# Altium footprint library 显示器件封装库.PcbLib: 45 footprints (part 1 of 3)
Each footprint in its own frame and in the unit in brackets; x right, y up, seen from the top. Pads: shape width x height; smd on the part's side, far side on the other; paste and mask are expansions set on the pad; w line width, h text height; cw(c..) or ccw(c..) is an arc to the next point about the centre after c.
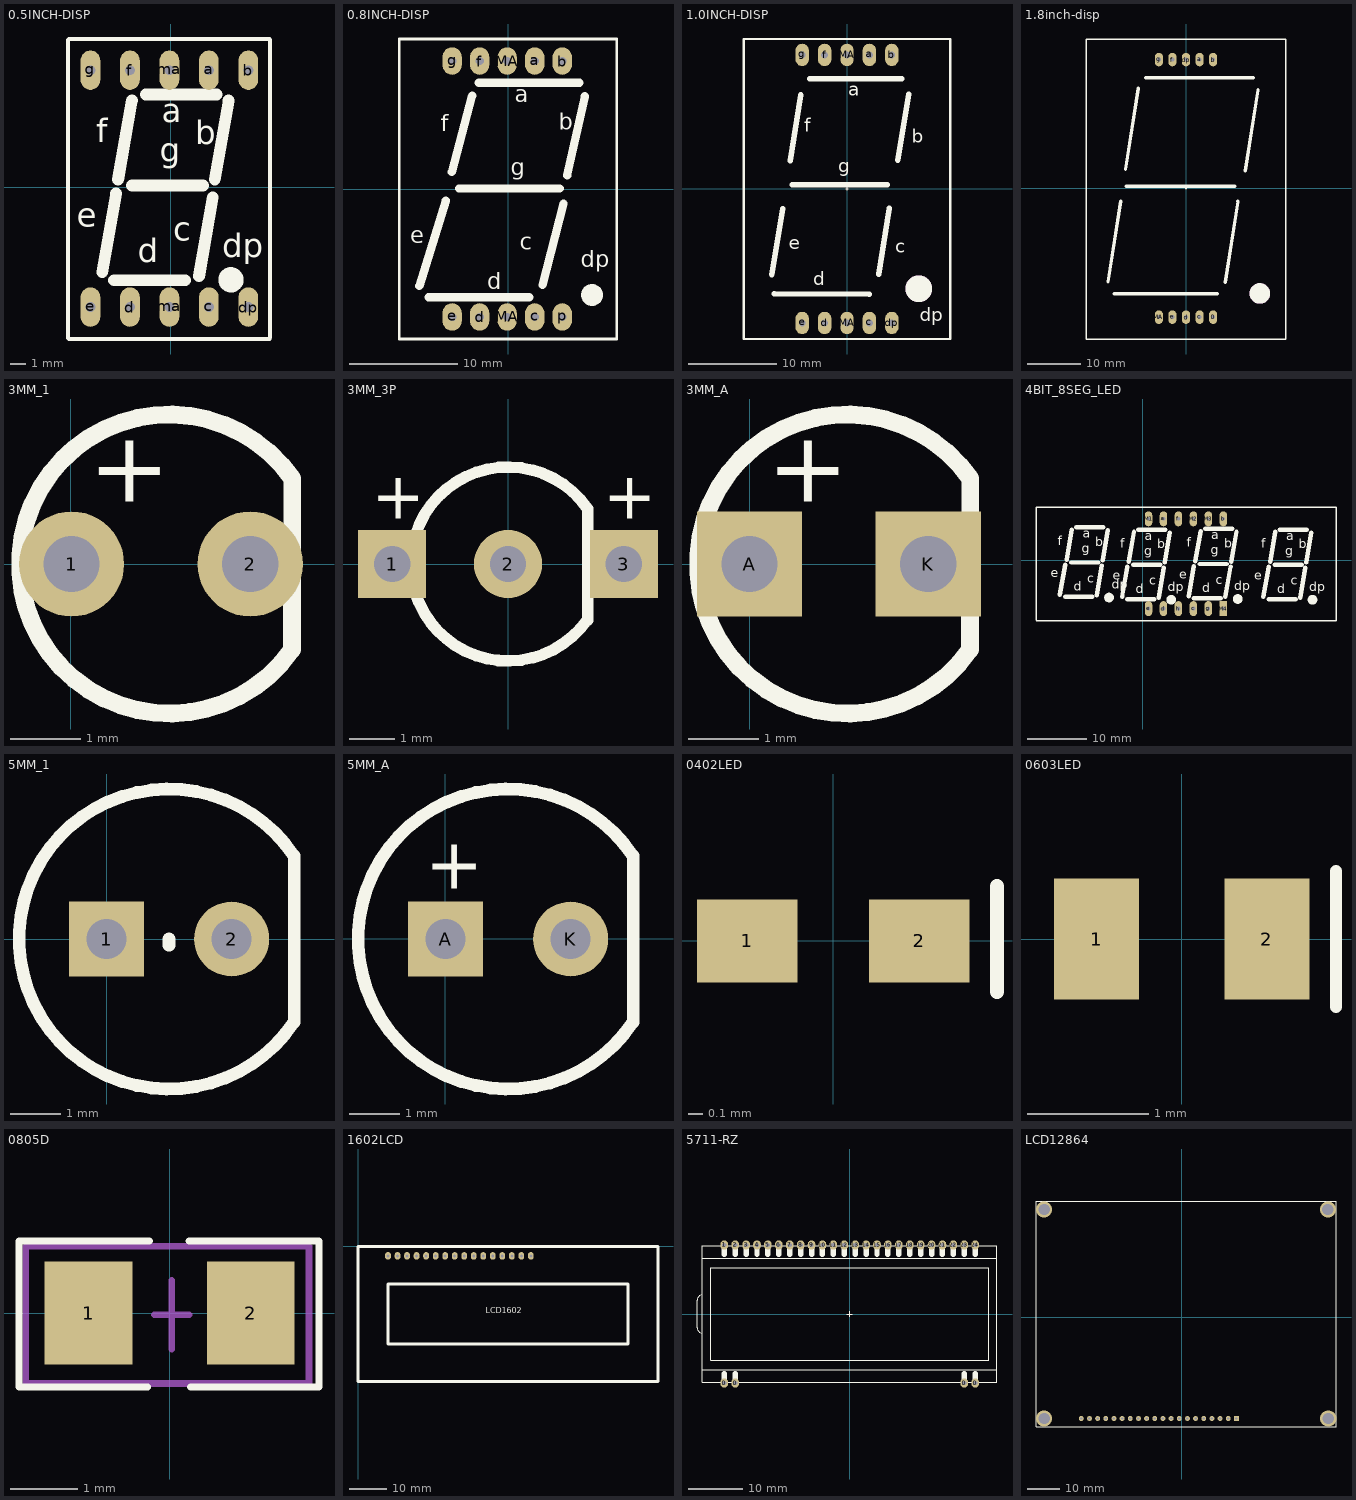
[diagram p0: the footprints below, top view; thin cyan lines are the x and y axes]

## 0.5INCH-DISP [mil]
pads (10):
  oval 50x100 hole 25: a(97,297) b(197,297) c(97,-303) d(-103,-303) dp(197,-303) e(-203,-303) f(-103,297) g(-203,297) ma(-3,-303) ma(-3,297)
Top Overlay:
  circle w40: c153,-234 r12
  lines w10: -260,-382 -260,374 ; -258,-384 251,-384 ; -258,376 251,376 ; 252,-380 252,374
  lines w30: -173,-215 -138,-15 ; -143,-235 37,-235 ; -133,20 -98,220 ; -98,5 82,5 ; -63,235 117,235 ; 72,-225 107,-25 ; 112,20 147,220
  text "f" at -188,115 h60
  text "b" at 62,110 h60
  text "g" at -28,65 h60
  text "a" at -23,165 h60
  text "d" at -83,-190 h60
  text "e" at -238,-100 h60
  text "dp" at 131,-177 h60
  text "c" at 7,-135 h60

## 0.8INCH-DISP [mil]
pads (10):
  oval 70x100 hole 30: a(97,465) b(197,465) c(97,-465) d(-103,-465) e(-203,-465) f(-103,465) g(-203,465) MA(-3,-465) MA(-3,465) p(197,-465)
Top Overlay:
  circle w40: c305.31,-385 r19.68
  lines w10: -395,-545 395,-545 395,545 -395,545 -395,-545
  lines w30: -322,-352 -226,-42 ; -289,-393 77.14,-393 ; -204,62 -130,339 ; -177.68,2.24 188.47,2.24 ; -108,-478 -103,-473 ; -106.14,386 260,386 ; 125,-349 202,-53 ; 215,49 279,337
  text "b" at 185,215 h60
  text "dp" at 265,-285 h60
  text "f" at -245,210 h60
  text "e" at -355,-198 h60
  text "d" at -75,-365 h60
  text "c" at 43,-220 h60
  text "g" at 10,50 h60
  text "a" at 25,315 h60

## 1.0INCH-DISP [mil]
pads (10):
  oval 60x100 hole 30: a(100,598) b(200,598) c(100,-598) d(-100,-598) dp(200,-598) e(-200,-598) f(-100,598) g(-200,598) MA(0,-598) MA(0,598)
Top Overlay:
  lines w2: -6,0 6,0 ; 0,-6 0,5
  lines w10: -461,-10 -461,10 ; -460.88,-669.58 -460.88,669 ; -459.88,-669.58 461,-669.58 461,669 -459.88,669
  lines w25: -335,-382 -287,-89 ; -324,-467 99,-470 ; -254,126 -206,419 ; -244,19 179,19 ; -167,492 245,492 ; 141,-380 189,-87 ; 227,129 275,422
  text "g" at -40,75 h60
  text "dp" at 325,-590 h60
  text "f" at -190,255 h60
  text "e" at -260,-270 h60
  text "d" at -150,-430 h60
  text "c" at 215,-285 h60
  text "b" at 290,205 h60
  text "a" at 5,415 h60
Top Overlay keep-out:
  circle w100: c320.57,-445 r9.43

## 1.8inch-disp [mil]
pads (10):
  oval 60x100 hole 30: 0(200,-950) a(100,950) b(200,950) c(100,-950) d(0,-950) dp(0,950) e(-100,-950) f(-100,950) g(-200,950) MA(-200,-950)
Top Overlay:
  lines w2: -5,0 5,0 ; 0,-5 0,4
  lines w10: -736,-1111 736,-1111 736,1101.6 -736,1101.6 -736,-1111
  lines w25: -575,-691 -481,-93 ; -528,-778 230,-778 ; -446,139 -352,737 ; -442,15 359,15 ; -299,815 496,815 ; 289,-694 383,-96 ; 437,128 531,726
Top Overlay keep-out:
  circle w100: c544.39,-775 r25.61
3D body: height 393.7, standoff 0, extent -733,-1106.36 723.7,1098.36

## 3MM_1 [mm]
pads (2):
  round 1.5 hole 0.8: 1(0.011,0) 2(2.561,0)
Top Overlay:
  lines w0.254: 3.157,-1.222 cw(c1.408,0) 3.159,1.219 3.157,-1.221
  text "+" at 0.254,0.889 h1.02

## 3MM_3P [mm]
pads (3):
  rect 1.5x1.5 hole 0.8: 1(-2.55,0) 3(2.55,0)
  round 1.5 hole 0.8: 2(0,0)
Top Overlay:
  lines w0.254: 1.749,-1.222 cw(c0,0) 1.751,1.218 ; 1.75,-1.24 1.75,1.2
  text "+" at -3,1 h1.02
  text "+" at 2.1,1 h1.02

## 3MM_A [mm]
pads (2):
  rect 1.5x1.5 hole 0.8: A(0,0) K(2.55,0)
Top Overlay:
  lines w0.254: 3.146,-1.222 cw(c1.397,0) 3.148,1.218 3.146,-1.222
  text "+" at 0.254,0.889 h1.02

## 4BIT_8SEG_LED [mil]
pads (12):
  oval 50x100 hole 25: a(137,277) b(537,277) c(337,-323) d(137,-323) e(37,-323) f(237,277) g(437,-323) h(237,-323) M1(37,277) M2(337,277) M3(437,277)
  rect 50x100 hole 25: M4(537,-323)
Top Overlay:
  circle w40: c188,-264 r12
  circle w40: c-227,-249 r12
  circle w40: c633,-259 r12
  circle w40: c1133,-264 r12
  lines w10: -715,-405 1290,-405 ; -715,-401 -715,355 1290,355 1290,-404
  lines w30: -555,-230 -520,-30 ; -520,-245 -340,-245 ; -510,5 -475,205 ; -480,-15 -300,-15 ; -445,220 -265,220 ; -310,-235 -275,-35 ; -270,0 -235,200 ; -140,-245 -105,-45 ; -105,-260 75,-260 ; -95,-10 -60,190 ; -65,-30 115,-30 ; -30,205 150,205 ; 105,-250 140,-50 ; 145,-15 180,185 ; 305,-240 340,-40 ; 340,-255 520,-255 ; 350,-5 385,195 ; 380,-25 560,-25 ; 415,210 595,210 ; 550,-245 585,-45 ; 590,-10 625,190 ; 805,-245 840,-45 ; 840,-260 1020,-260 ; 850,-10 885,190 ; 880,-30 1060,-30 ; 915,205 1095,205 ; 1050,-250 1085,-50 ; 1090,-15 1125,185
  text "c" at 42,-165 h60
  text "dp" at 166,-207 h60
  text "e" at -203,-130 h60
  text "d" at -48,-220 h60
  text "a" at 12,135 h60
  text "g" at 7,35 h60
  text "b" at 97,80 h60
  text "f" at -153,85 h60
  text "c" at -373,-150 h60
  text "dp" at -209,-192 h60
  text "e" at -618,-115 h60
  text "d" at -463,-205 h60
  text "a" at -403,150 h60
  text "g" at -408,50 h60
  text "b" at -318,95 h60
  text "f" at -568,100 h60
  text "c" at 487,-160 h60
  text "dp" at 611,-202 h60
  text "e" at 242,-125 h60
  text "d" at 397,-215 h60
  text "a" at 457,140 h60
  text "g" at 452,40 h60
  text "b" at 542,85 h60
  text "f" at 292,90 h60
  text "c" at 987,-165 h60
  text "dp" at 1111,-207 h60
  text "e" at 742,-130 h60
  text "d" at 897,-220 h60
  text "a" at 957,135 h60
  text "g" at 952,35 h60
  text "b" at 1042,80 h60
  text "f" at 792,85 h60

## 5MM_1 [mm]
pads (2):
  rect 1.5x1.5 hole 0.8: 1(0,0)
  round 1.5 hole 0.8: 2(2.5,0)
Top Overlay:
  lines w0.254: 1.247,-0.127 1.247,0 ; 3.747,-1.658 cw(c1.247,0) 3.747,1.658 ; 3.75,-1.66 3.75,1.66

## 5MM_A [mm]
pads (2):
  rect 1.5x1.5 hole 0.8: A(0.005,-0.001)
  round 1.5 hole 0.8: K(2.505,-0.001)
Top Overlay:
  lines w0.254: 3.753,-1.659 cw(c1.252,-0.001) 3.753,1.657 ; 3.755,-1.661 3.755,1.659
  text "+" at -0.4,1 h1.02

## 0402LED [mm]
pads (2):
  rect 0.7x0.58 smd: 1(-0.6,0) 2(0.6,0)
Top Overlay:
  lines w0.1: 1.143,-0.356 1.143,0.381
3D body: height 0.45, standoff 0, extent -0.505,-0.25 0.505,0.25

## 0603LED [mm]
pads (2):
  rect 0.7x1 smd: 1(-0.7,0) 2(0.7,0)
Top Overlay:
  lines w0.1: 1.27,-0.559 1.27,0.559
3D body: height 0.6, standoff 0, extent -0.81,-0.4 0.81,0.4

## 0805D [mm]
pads (2):
  rect 1.3x1.524 smd: 1(-1.2,0) 2(1.2,0)
Top Overlay:
  lines w0.102: -0.324,-1.092 -2.229,-1.092 -2.229,1.067 -0.298,1.067 ; 0.286,1.067 2.21,1.067 2.21,-1.092 0.311,-1.092
Mechanical 15:
  lines w0.1: -0.222,-0.025 0.286,-0.025 ; 0.032,-0.533 0.032,0.483 ; -2.127,-1.041 -2.127,0.991 2.064,0.991 2.064,-1.041 -2.127,-1.041
3D body: height 1.07, standoff -0.03, extent -1.6,-0.8 1.6,0.8

## 1602LCD [mil] "LCD module 16*2 char"
pads (16):
  oval 60x80 hole 30: 1(314.96,-98.43) 2(414.96,-98.43) 3(514.96,-98.43) 4(614.96,-98.43) 5(714.96,-98.43) 6(814.96,-98.43) 7(914.96,-98.43) 8(1014.96,-98.43) 9(1114.96,-98.43) 10(1214.96,-98.43) 11(1314.96,-98.43) 12(1414.96,-98.43) 13(1514.96,-98.43) 14(1614.96,-98.43) 15(1714.96,-98.43) 16(1814.96,-98.43)
Top Overlay:
  lines w30: 0,-1417.32 3149.61,-1417.32 3149.61,0 0,0 0,-1417.32 ; 314.96,-1023.62 2834.65,-1023.62 2834.65,-393.7 314.96,-393.7 314.96,-1023.62
  text "LCD1602" at 1340,-700 h60
3D body: height 354.33, standoff -145.67, extent -5.8,-1401.95 3143.8,-24

## 5711-RZ [mm]
pads (28):
  oval 1.4x1.7 hole 0.8: 0(-23,-12.65) 0(-21,-12.65) 0(21,-12.65) 0(23,-12.65) 1(-23,12.65) 2(-21,12.65) 3(-19,12.65) 4(-17,12.65) 5(-15,12.65) 6(-13,12.65) 7(-11,12.65) 8(-9,12.65) 9(-7,12.65) 10(-5,12.65) 11(-3,12.65) 12(-1,12.65) 13(1,12.65) 14(3,12.65) 15(5,12.65) 16(7,12.65) 17(9,12.65) 18(11,12.65) 19(13,12.65) 20(15,12.65) 21(17,12.65) 22(19,12.65) 23(21,12.65) 24(23,12.65)
Top Overlay:
  lines w0.15: -27,-10.25 27,-10.25 ; -27,-3.5 cw(c-27,-2.5) -28,-2.5 -28,2.5 cw(c-27,2.5) -27,3.5 ; -27,10.25 27,10.25 ; -0.5,0 0.5,0 ; 0,-0.5 0,0.5 ; -27,-12.5 -27,12.5 27,12.5 27,-12.5 -27,-12.5 ; -25.5,-8.5 25.5,-8.5 25.5,8.5 -25.5,8.5 -25.5,-8.5
  lines w1: -23,-12.65 -23,-10.99 ; -23,10.99 -23,12.65 ; -21,-12.65 -21,-10.99 ; -21,10.99 -21,12.65 ; -19,10.99 -19,12.65 ; -17,10.99 -17,12.65 ; -15,10.99 -15,12.65 ; -13,10.99 -13,12.65 ; -11,10.99 -11,12.65 ; -9,10.99 -9,12.65 ; -7,10.99 -7,12.65 ; -5,10.99 -5,12.65 ; -3,10.99 -3,12.65 ; -1,10.99 -1,12.65 ; 1,10.99 1,12.65 ; 3,10.99 3,12.65 ; 5,10.99 5,12.65 ; 7,10.99 7,12.65 ; 9,10.99 9,12.65 ; 11,10.99 11,12.65 ; 13,10.99 13,12.65 ; 15,10.99 15,12.65 ; 17,10.99 17,12.65 ; 19,10.99 19,12.65 ; 21,-12.65 21,-10.99 ; 21,10.99 21,12.65 ; 23,-12.65 23,-10.99 ; 23,10.99 23,12.65

## LCD12864 [mil]
pads (20):
  rect 60x60 hole 30: 1(672.44,-1238.19)
  round 60 hole 30: 2(572.44,-1238.19) 3(472.44,-1238.19) 4(372.44,-1238.19) 5(272.44,-1238.19) 6(172.44,-1238.19) 7(72.44,-1238.19) 8(-27.56,-1238.19) 9(-127.56,-1238.19) 10(-227.56,-1238.19) 11(-327.56,-1238.19) 12(-427.56,-1238.19) 13(-527.56,-1238.19) 14(-627.56,-1238.19) 15(-727.56,-1238.19) 16(-827.56,-1238.19) 17(-927.56,-1238.19) 18(-1027.56,-1238.19) 19(-1127.56,-1238.19) 20(-1227.56,-1238.19)
via -1682.56,-1238.19 diameter 196.85 hole 137.8
via 1797.44,-1238.19 diameter 196.85 hole 137.8
via 1792.44,1321.81 diameter 196.85 hole 137.8
via -1682.56,1321.81 diameter 196.85 hole 137.8
Top Overlay:
  lines w10: -1782.56,-1338.19 1892.44,-1338.19 1892.44,1421.81 -1782.56,1421.81 -1782.56,-1338.19
3D body: height 862.6, standoff -124.02, extent -1771.65,-1334.25 1889.77,1421.66